# Altium integrated library 兰格封装.IntLib: 1176 symbols (part 1 of 6) (continued)
## SGM6132 (continued)
SOIC 8; 仓库名称: 元件仓; 单位: ֻ; 加工方式: 贴片; 物料代码: *; 物料名称: *; 助记码: *; 规格型号: *; 备注: *
footprint SOIC 8
pins: 0 GND, 1 BS, 2 IN, 3 SW, 4 GND, 5 FB, 6 COMP, 7 EN, 8 SS

## SGM8652
designator U?
规格型号: SOP8; 仓库名称: 元件仓; 单位: ֻ; 加工方式: 贴片; 备注: *
footprint SOP 8
part A pins: 1 OUT, 2 -, 3 +
part B pins: 5 +, 6 -, 7 OUT
part C pins: 4 -, 8 +

## SI4800BDY-T1-E3
designator U?
N-Channel Reduced Qg, Fast Switching MOSFET; 仓库名称: 元件仓; 单位: ֻ; 加工方式: 贴片; 物料名称: *; 物料代码: *; 助记码: *; 规格型号: *; 备注: *
footprint SOP 8
pins: 1 S, 2 S, 3 S, 4 G, 5 D, 6 D, 7 D, 8 D

## STM32F030K6T6
designator U?
LQFP32; 仓库名称: 元件仓; 单位: ֻ; 加工方式: 贴片; 物料名称: *; 物料代码: *; 助记码: *; 规格型号: *; 备注: *
footprint LQFP  32 7X7 (32脚，体宽7x7mm，脚距0.8mm)
pins: 1 VDD, 2 PF0-OSC_IN, 3 PF1-OSC_OUT, 4 NRST, 5 VDDA, 6 PA0, 7 PA1, 8 PA2, 9 PA3, 10 PA4, 11 PA5, 12 PA6, 13 PA7, 14 PB0, 15 PB1, 16 VSS, 17 VDD, 18 PA8, 19 PA9, 20 PA10, 21 PA11, 22 PA12, 23 PA13, 24 PA14, 25 PA15, 26 PB3, 27 PB4, 28 PB5, 29 PB6, 30 PB7, 31 BOOT0, 32 VSS

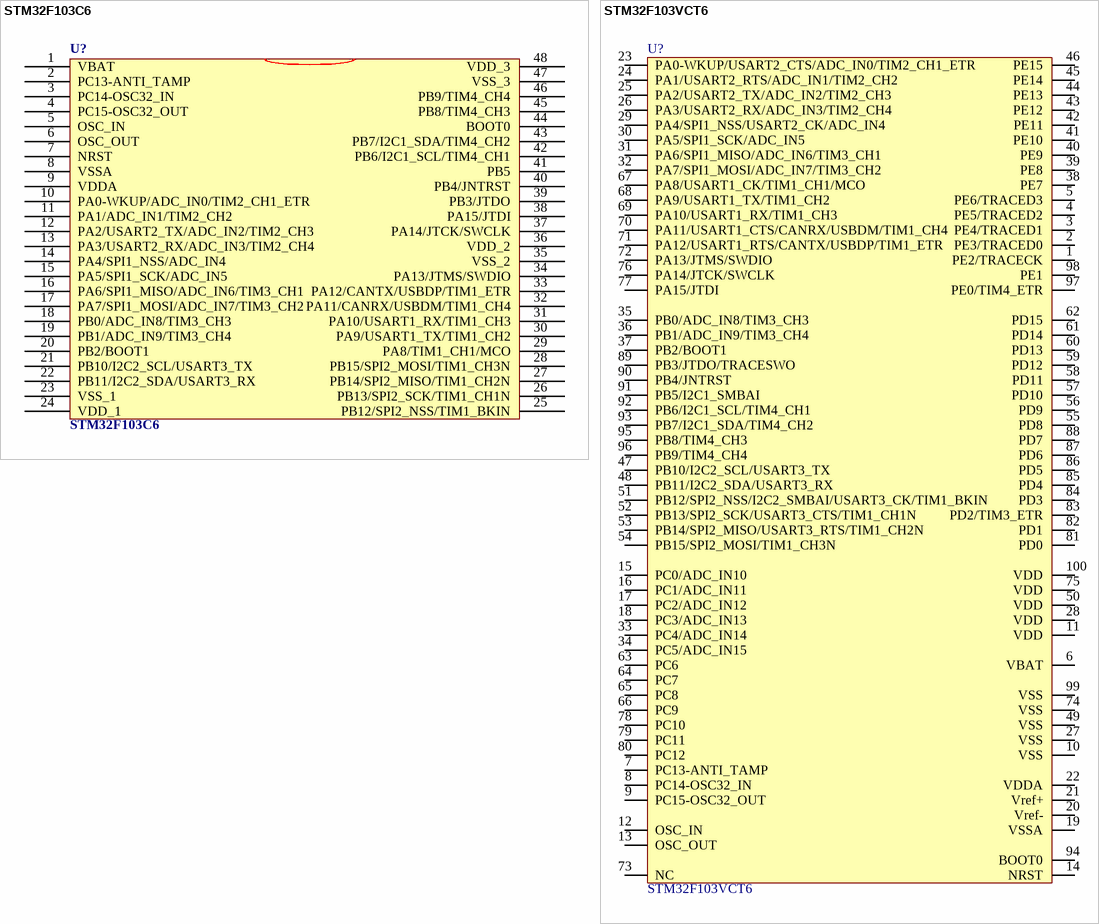
[diagram p7: symbols STM32F103C6 to STM32F103VCT6]

## STM32F103C6
designator U?
LQFP48S; 单位: ֻ; 仓库名称: 元件仓; 加工方式: 贴片; 物料名称: *; 物料代码: *; 助记码: *; 规格型号: *; 备注: *
footprint LQFP  48
pins: 1 VBAT, 2 PC13-ANTI_TAMP, 3 PC14-OSC32_IN, 4 PC15-OSC32_OUT, 5 OSC_IN, 6 OSC_OUT, 7 NRST, 8 VSSA, 9 VDDA, 10 PA0-WKUP/ADC_IN0/TIM2_CH1_ETR, 11 PA1/ADC_IN1/TIM2_CH2, 12 PA2/USART2_TX/ADC_IN2/TIM2_CH3, 13 PA3/USART2_RX/ADC_IN3/TIM2_CH4, 14 PA4/SPI1_NSS/ADC_IN4, 15 PA5/SPI1_SCK/ADC_IN5, 16 PA6/SPI1_MISO/ADC_IN6/TIM3_CH1, 17 PA7/SPI1_MOSI/ADC_IN7/TIM3_CH2, 18 PB0/ADC_IN8/TIM3_CH3, 19 PB1/ADC_IN9/TIM3_CH4, 20 PB2/BOOT1, 21 PB10/I2C2_SCL/USART3_TX, 22 PB11/I2C2_SDA/USART3_RX, 23 VSS_1, 24 VDD_1, 25 PB12/SPI2_NSS/TIM1_BKIN, 26 PB13/SPI2_SCK/TIM1_CH1N, 27 PB14/SPI2_MISO/TIM1_CH2N, 28 PB15/SPI2_MOSI/TIM1_CH3N, 29 PA8/TIM1_CH1/MCO, 30 PA9/USART1_TX/TIM1_CH2, 31 PA10/USART1_RX/TIM1_CH3, 32 PA11/CANRX/USBDM/TIM1_CH4, 33 PA12/CANTX/USBDP/TIM1_ETR, 34 PA13/JTMS/SWDIO, 35 VSS_2, 36 VDD_2, 37 PA14/JTCK/SWCLK, 38 PA15/JTDI, 39 PB3/JTDO, 40 PB4/JNTRST, 41 PB5, 42 PB6/I2C1_SCL/TIM4_CH1, 43 PB7/I2C1_SDA/TIM4_CH2, 44 BOOT0, 45 PB8/TIM4_CH3, 46 PB9/TIM4_CH4, 47 VSS_3, 48 VDD_3
2 alternate drawings of the same symbol

## STM32F103VCT6
designator U?
LQFP100; 仓库名称: 元件仓; 单位: ֻ; 加工方式: 贴片; 物料代码: *; 物料名称: *; 助记码: *; 规格型号: *; 备注: *
footprint LQFP 100
pins: 1 PE2/TRACECK, 2 PE3/TRACED0, 3 PE4/TRACED1, 4 PE5/TRACED2, 5 PE6/TRACED3, 6 VBAT, 7 PC13-ANTI_TAMP, 8 PC14-OSC32_IN, 9 PC15-OSC32_OUT, 10 VSS, 11 VDD, 12 OSC_IN, 13 OSC_OUT, 14 NRST, 15 PC0/ADC_IN10, 16 PC1/ADC_IN11, 17 PC2/ADC_IN12, 18 PC3/ADC_IN13, 19 VSSA, 20 Vref-, 21 Vref+, 22 VDDA, 23 PA0-WKUP/USART2_CTS/ADC_IN0/TIM2_CH1_ETR, 24 PA1/USART2_RTS/ADC_IN1/TIM2_CH2, 25 PA2/USART2_TX/ADC_IN2/TIM2_CH3, 26 PA3/USART2_RX/ADC_IN3/TIM2_CH4, 27 VSS, 28 VDD, 29 PA4/SPI1_NSS/USART2_CK/ADC_IN4, 30 PA5/SPI1_SCK/ADC_IN5, 31 PA6/SPI1_MISO/ADC_IN6/TIM3_CH1, 32 PA7/SPI1_MOSI/ADC_IN7/TIM3_CH2, 33 PC4/ADC_IN14, 34 PC5/ADC_IN15, 35 PB0/ADC_IN8/TIM3_CH3, 36 PB1/ADC_IN9/TIM3_CH4, 37 PB2/BOOT1, 38 PE7, 39 PE8, 40 PE9, 41 PE10, 42 PE11, 43 PE12, 44 PE13, 45 PE14, 46 PE15, 47 PB10/I2C2_SCL/USART3_TX, 48 PB11/I2C2_SDA/USART3_RX, 49 VSS, 50 VDD, 51 PB12/SPI2_NSS/I2C2_SMBAI/USART3_CK/TIM1_BKIN, 52 PB13/SPI2_SCK/USART3_CTS/TIM1_CH1N, 53 PB14/SPI2_MISO/USART3_RTS/TIM1_CH2N, 54 PB15/SPI2_MOSI/TIM1_CH3N, 55 PD8, 56 PD9, 57 PD10, 58 PD11, 59 PD12, 60 PD13, 61 PD14, 62 PD15, 63 PC6, 64 PC7, 65 PC8, 66 PC9, 67 PA8/USART1_CK/TIM1_CH1/MCO, 68 PA9/USART1_TX/TIM1_CH2, 69 PA10/USART1_RX/TIM1_CH3, 70 PA11/USART1_CTS/CANRX/USBDM/TIM1_CH4, 71 PA12/USART1_RTS/CANTX/USBDP/TIM1_ETR, 72 PA13/JTMS/SWDIO, 73 NC, 74 VSS, 75 VDD, 76 PA14/JTCK/SWCLK, 77 PA15/JTDI, 78 PC10, 79 PC11, 80 PC12, 81 PD0, 82 PD1, 83 PD2/TIM3_ETR, 84 PD3, 85 PD4, 86 PD5, 87 PD6, 88 PD7, 89 PB3/JTDO/TRACESWO, 90 PB4/JNTRST, 91 PB5/I2C1_SMBAI, 92 PB6/I2C1_SCL/TIM4_CH1, 93 PB7/I2C1_SDA/TIM4_CH2, 94 BOOT0, 95 PB8/TIM4_CH3, 96 PB9/TIM4_CH4, 97 PE0/TIM4_ETR, 98 PE1, 99 VSS, 100 VDD

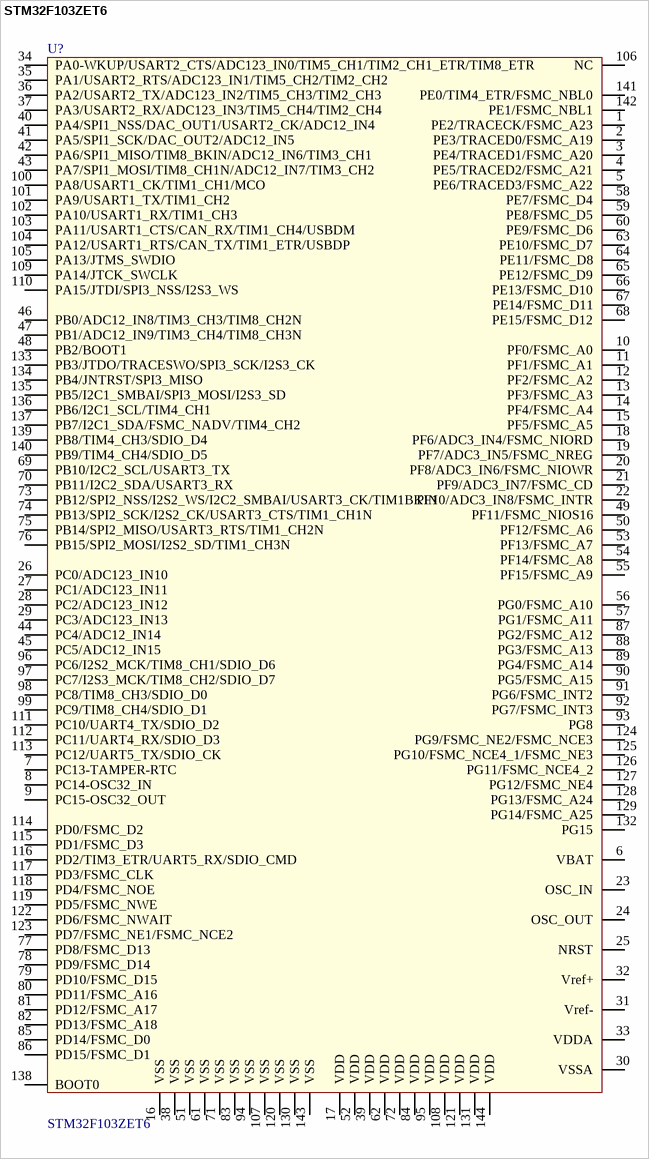
[diagram p8: symbol STM32F103ZET6]

## STM32F103ZET6
designator U?
LQFP144; 仓库名称: 元件仓; 单位: ֻ; 加工方式: 贴片; 物料代码: *; 物料名称: *; 助记码: *; 规格型号: *; 备注: *
footprint LQFP 144
pins: 1 PE2/TRACECK/FSMC_A23, 2 PE3/TRACED0/FSMC_A19, 3 PE4/TRACED1/FSMC_A20, 4 PE5/TRACED2/FSMC_A21, 5 PE6/TRACED3/FSMC_A22, 6 VBAT, 7 PC13-TAMPER-RTC, 8 PC14-OSC32_IN, 9 PC15-OSC32_OUT, 10 PF0/FSMC_A0, 11 PF1/FSMC_A1, 12 PF2/FSMC_A2, 13 PF3/FSMC_A3, 14 PF4/FSMC_A4, 15 PF5/FSMC_A5, 16 VSS, 17 VDD, 18 PF6/ADC3_IN4/FSMC_NIORD, 19 PF7/ADC3_IN5/FSMC_NREG, 20 PF8/ADC3_IN6/FSMC_NIOWR, 21 PF9/ADC3_IN7/FSMC_CD, 22 PF10/ADC3_IN8/FSMC_INTR, 23 OSC_IN, 24 OSC_OUT, 25 NRST, 26 PC0/ADC123_IN10, 27 PC1/ADC123_IN11, 28 PC2/ADC123_IN12, 29 PC3/ADC123_IN13, 30 VSSA, 31 Vref-, 32 Vref+, 33 VDDA, 34 PA0-WKUP/USART2_CTS/ADC123_IN0/TIM5_CH1/TIM2_CH1_ETR/TIM8_ETR, 35 PA1/USART2_RTS/ADC123_IN1/TIM5_CH2/TIM2_CH2, 36 PA2/USART2_TX/ADC123_IN2/TIM5_CH3/TIM2_CH3, 37 PA3/USART2_RX/ADC123_IN3/TIM5_CH4/TIM2_CH4, 38 VSS, 39 VDD, 40 PA4/SPI1_NSS/DAC_OUT1/USART2_CK/ADC12_IN4, 41 PA5/SPI1_SCK/DAC_OUT2/ADC12_IN5, 42 PA6/SPI1_MISO/TIM8_BKIN/ADC12_IN6/TIM3_CH1, 43 PA7/SPI1_MOSI/TIM8_CH1N/ADC12_IN7/TIM3_CH2, 44 PC4/ADC12_IN14, 45 PC5/ADC12_IN15, 46 PB0/ADC12_IN8/TIM3_CH3/TIM8_CH2N, 47 PB1/ADC12_IN9/TIM3_CH4/TIM8_CH3N, 48 PB2/BOOT1, 49 PF11/FSMC_NIOS16, 50 PF12/FSMC_A6, 51 VSS, 52 VDD, 53 PF13/FSMC_A7, 54 PF14/FSMC_A8, 55 PF15/FSMC_A9, 56 PG0/FSMC_A10, 57 PG1/FSMC_A11, 58 PE7/FSMC_D4, 59 PE8/FSMC_D5, 60 PE9/FSMC_D6, 61 VSS, 62 VDD, 63 PE10/FSMC_D7, 64 PE11/FSMC_D8, 65 PE12/FSMC_D9, 66 PE13/FSMC_D10, 67 PE14/FSMC_D11, 68 PE15/FSMC_D12, 69 PB10/I2C2_SCL/USART3_TX, 70 PB11/I2C2_SDA/USART3_RX, 71 VSS, 72 VDD, 73 PB12/SPI2_NSS/I2S2_WS/I2C2_SMBAI/USART3_CK/TIM1BKIN, 74 PB13/SPI2_SCK/I2S2_CK/USART3_CTS/TIM1_CH1N, 75 PB14/SPI2_MISO/USART3_RTS/TIM1_CH2N, 76 PB15/SPI2_MOSI/I2S2_SD/TIM1_CH3N, 77 PD8/FSMC_D13, 78 PD9/FSMC_D14, 79 PD10/FSMC_D15, 80 PD11/FSMC_A16, 81 PD12/FSMC_A17, 82 PD13/FSMC_A18, 83 VSS, 84 VDD, 85 PD14/FSMC_D0, 86 PD15/FSMC_D1, 87 PG2/FSMC_A12, 88 PG3/FSMC_A13, 89 PG4/FSMC_A14, 90 PG5/FSMC_A15, 91 PG6/FSMC_INT2, 92 PG7/FSMC_INT3, 93 PG8, 94 VSS, 95 VDD, 96 PC6/I2S2_MCK/TIM8_CH1/SDIO_D6, 97 PC7/I2S3_MCK/TIM8_CH2/SDIO_D7, 98 PC8/TIM8_CH3/SDIO_D0, 99 PC9/TIM8_CH4/SDIO_D1, 100 PA8/USART1_CK/TIM1_CH1/MCO, 101 PA9/USART1_TX/TIM1_CH2, 102 PA10/USART1_RX/TIM1_CH3, 103 PA11/USART1_CTS/CAN_RX/TIM1_CH4/USBDM, 104 PA12/USART1_RTS/CAN_TX/TIM1_ETR/USBDP, 105 PA13/JTMS_SWDIO, 106 NC, 107 VSS, 108 VDD, 109 PA14/JTCK_SWCLK, 110 PA15/JTDI/SPI3_NSS/I2S3_WS, 111 PC10/UART4_TX/SDIO_D2, 112 PC11/UART4_RX/SDIO_D3, 113 PC12/UART5_TX/SDIO_CK, 114 PD0/FSMC_D2, 115 PD1/FSMC_D3, 116 PD2/TIM3_ETR/UART5_RX/SDIO_CMD, 117 PD3/FSMC_CLK, 118 PD4/FSMC_NOE, 119 PD5/FSMC_NWE, 120 VSS, 121 VDD, 122 PD6/FSMC_NWAIT, 123 PD7/FSMC_NE1/FSMC_NCE2, 124 PG9/FSMC_NE2/FSMC_NCE3, 125 PG10/FSMC_NCE4_1/FSMC_NE3, 126 PG11/FSMC_NCE4_2, 127 PG12/FSMC_NE4, 128 PG13/FSMC_A24, 129 PG14/FSMC_A25, 130 VSS, 131 VDD, 132 PG15, 133 PB3/JTDO/TRACESWO/SPI3_SCK/I2S3_CK, 134 PB4/JNTRST/SPI3_MISO, 135 PB5/I2C1_SMBAI/SPI3_MOSI/I2S3_SD, 136 PB6/I2C1_SCL/TIM4_CH1, 137 PB7/I2C1_SDA/FSMC_NADV/TIM4_CH2, 138 BOOT0, 139 PB8/TIM4_CH3/SDIO_D4, 140 PB9/TIM4_CH4/SDIO_D5, 141 PE0/TIM4_ETR/FSMC_NBL0, 142 PE1/FSMC_NBL1, 143 VSS, 144 VDD

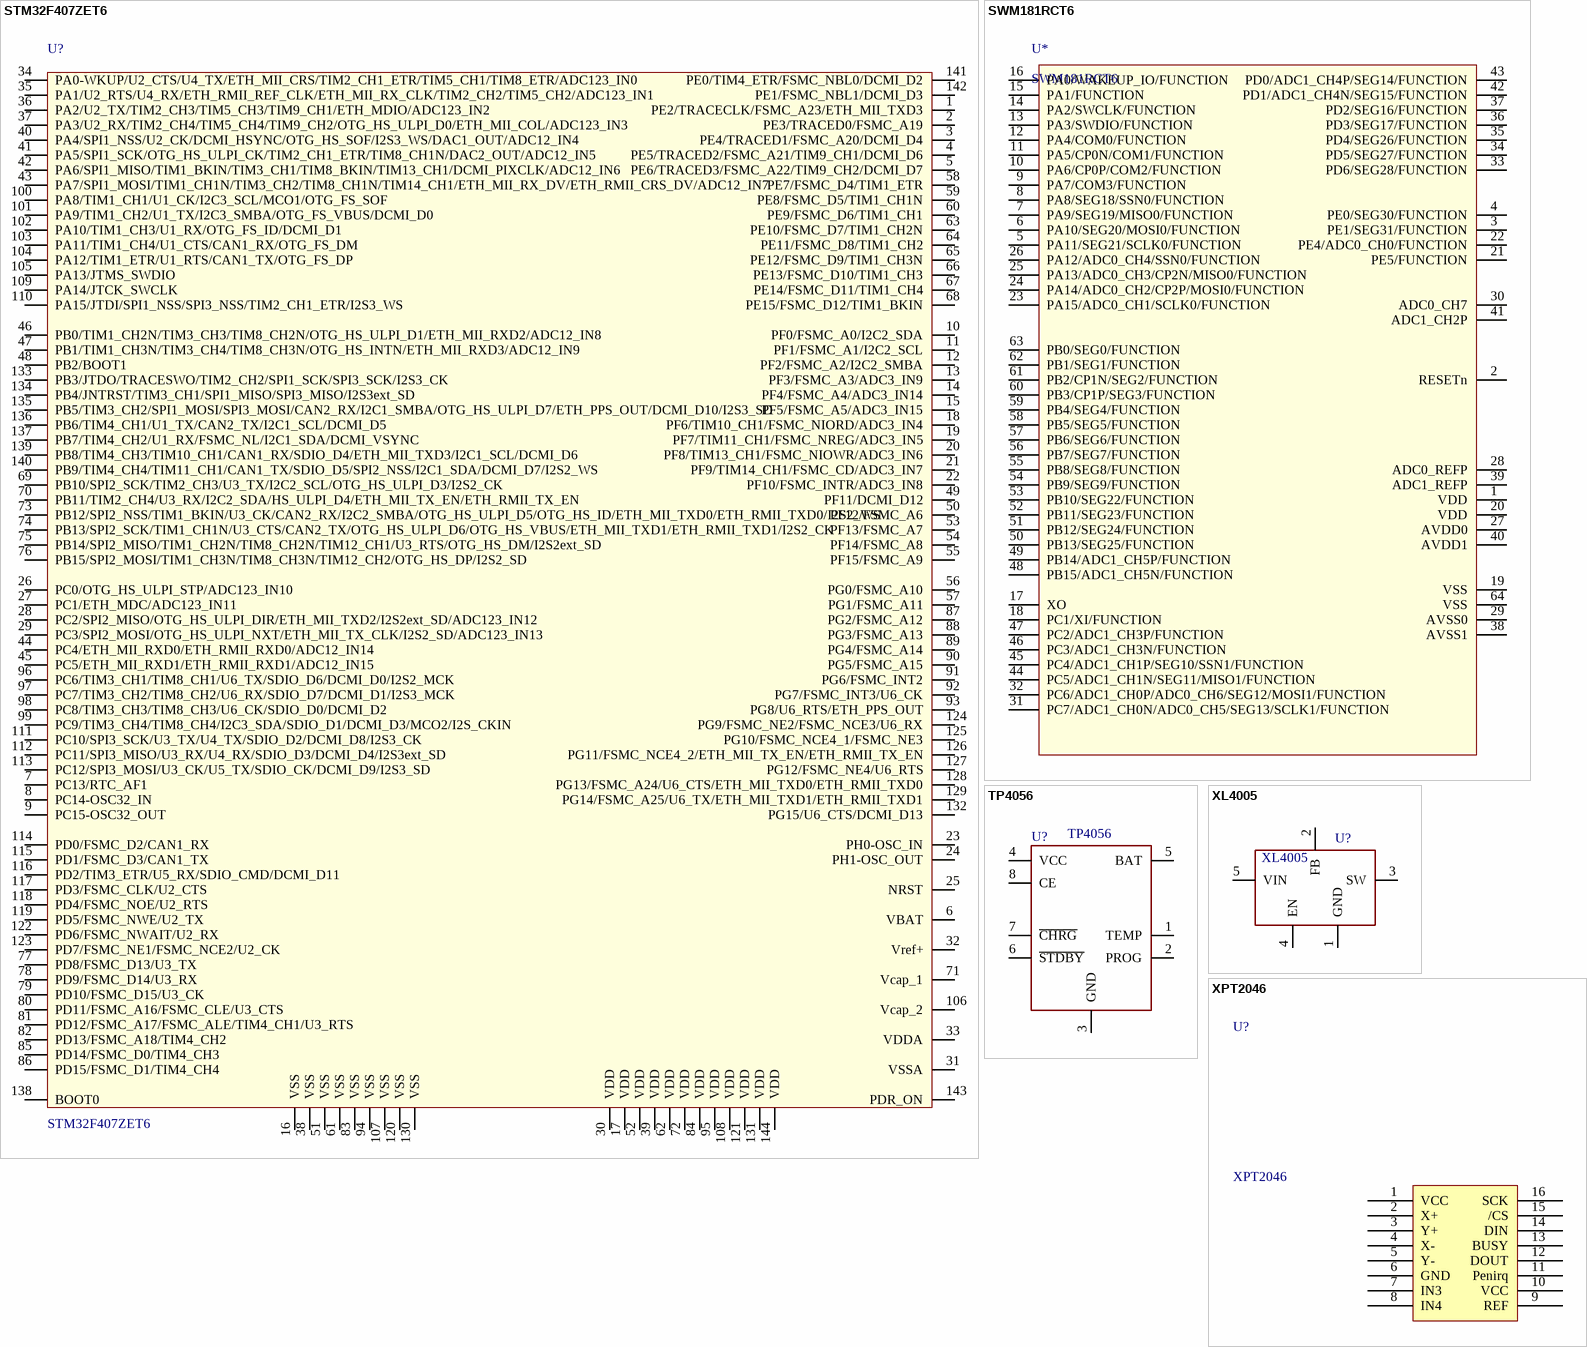
[diagram p9: symbols STM32F407ZET6 to XPT2046]

## STM32F407ZET6
designator U?
LQFP144; 仓库名称: 元件仓; 单位: ֻ; 加工方式: 贴片; 物料名称: *; 物料代码: *; 助记码: *; 规格型号: *; 备注: *
footprint LQFP 144
pins: 1 PE2/TRACECLK/FSMC_A23/ETH_MII_TXD3, 2 PE3/TRACED0/FSMC_A19, 3 PE4/TRACED1/FSMC_A20/DCMI_D4, 4 PE5/TRACED2/FSMC_A21/TIM9_CH1/DCMI_D6, 5 PE6/TRACED3/FSMC_A22/TIM9_CH2/DCMI_D7, 6 VBAT, 7 PC13/RTC_AF1, 8 PC14-OSC32_IN, 9 PC15-OSC32_OUT, 10 PF0/FSMC_A0/I2C2_SDA, 11 PF1/FSMC_A1/I2C2_SCL, 12 PF2/FSMC_A2/I2C2_SMBA, 13 PF3/FSMC_A3/ADC3_IN9, 14 PF4/FSMC_A4/ADC3_IN14, 15 PF5/FSMC_A5/ADC3_IN15, 16 VSS, 17 VDD, 18 PF6/TIM10_CH1/FSMC_NIORD/ADC3_IN4, 19 PF7/TIM11_CH1/FSMC_NREG/ADC3_IN5, 20 PF8/TIM13_CH1/FSMC_NIOWR/ADC3_IN6, 21 PF9/TIM14_CH1/FSMC_CD/ADC3_IN7, 22 PF10/FSMC_INTR/ADC3_IN8, 23 PH0-OSC_IN, 24 PH1-OSC_OUT, 25 NRST, 26 PC0/OTG_HS_ULPI_STP/ADC123_IN10, 27 PC1/ETH_MDC/ADC123_IN11, 28 PC2/SPI2_MISO/OTG_HS_ULPI_DIR/ETH_MII_TXD2/I2S2ext_SD/ADC123_IN12, 29 PC3/SPI2_MOSI/OTG_HS_ULPI_NXT/ETH_MII_TX_CLK/I2S2_SD/ADC123_IN13, 30 VDD, 31 VSSA, 32 Vref+, 33 VDDA, 34 PA0-WKUP/U2_CTS/U4_TX/ETH_MII_CRS/TIM2_CH1_ETR/TIM5_CH1/TIM8_ETR/ADC123_IN0, 35 PA1/U2_RTS/U4_RX/ETH_RMII_REF_CLK/ETH_MII_RX_CLK/TIM2_CH2/TIM5_CH2/ADC123_IN1, 36 PA2/U2_TX/TIM2_CH3/TIM5_CH3/TIM9_CH1/ETH_MDIO/ADC123_IN2, 37 PA3/U2_RX/TIM2_CH4/TIM5_CH4/TIM9_CH2/OTG_HS_ULPI_D0/ETH_MII_COL/ADC123_IN3, 38 VSS, 39 VDD, 40 PA4/SPI1_NSS/U2_CK/DCMI_HSYNC/OTG_HS_SOF/I2S3_WS/DAC1_OUT/ADC12_IN4, 41 PA5/SPI1_SCK/OTG_HS_ULPI_CK/TIM2_CH1_ETR/TIM8_CH1N/DAC2_OUT/ADC12_IN5, 42 PA6/SPI1_MISO/TIM1_BKIN/TIM3_CH1/TIM8_BKIN/TIM13_CH1/DCMI_PIXCLK/ADC12_IN6, 43 PA7/SPI1_MOSI/TIM1_CH1N/TIM3_CH2/TIM8_CH1N/TIM14_CH1/ETH_MII_RX_DV/ETH_RMII_CRS_DV/ADC12_IN7, 44 PC4/ETH_MII_RXD0/ETH_RMII_RXD0/ADC12_IN14, 45 PC5/ETH_MII_RXD1/ETH_RMII_RXD1/ADC12_IN15, 46 PB0/TIM1_CH2N/TIM3_CH3/TIM8_CH2N/OTG_HS_ULPI_D1/ETH_MII_RXD2/ADC12_IN8, 47 PB1/TIM1_CH3N/TIM3_CH4/TIM8_CH3N/OTG_HS_INTN/ETH_MII_RXD3/ADC12_IN9, 48 PB2/BOOT1, 49 PF11/DCMI_D12, 50 PF12/FSMC_A6, 51 VSS, 52 VDD, 53 PF13/FSMC_A7, 54 PF14/FSMC_A8, 55 PF15/FSMC_A9, 56 PG0/FSMC_A10, 57 PG1/FSMC_A11, 58 PE7/FSMC_D4/TIM1_ETR, 59 PE8/FSMC_D5/TIM1_CH1N, 60 PE9/FSMC_D6/TIM1_CH1, 61 VSS, 62 VDD, 63 PE10/FSMC_D7/TIM1_CH2N, 64 PE11/FSMC_D8/TIM1_CH2, 65 PE12/FSMC_D9/TIM1_CH3N, 66 PE13/FSMC_D10/TIM1_CH3, 67 PE14/FSMC_D11/TIM1_CH4, 68 PE15/FSMC_D12/TIM1_BKIN, 69 PB10/SPI2_SCK/TIM2_CH3/U3_TX/I2C2_SCL/OTG_HS_ULPI_D3/I2S2_CK, 70 PB11/TIM2_CH4/U3_RX/I2C2_SDA/HS_ULPI_D4/ETH_MII_TX_EN/ETH_RMII_TX_EN, 71 Vcap_1, 72 VDD, 73 PB12/SPI2_NSS/TIM1_BKIN/U3_CK/CAN2_RX/I2C2_SMBA/OTG_HS_ULPI_D5/OTG_HS_ID/ETH_MII_TXD0/ETH_RMII_TXD0/I2S2_WS, 74 PB13/SPI2_SCK/TIM1_CH1N/U3_CTS/CAN2_TX/OTG_HS_ULPI_D6/OTG_HS_VBUS/ETH_MII_TXD1/ETH_RMII_TXD1/I2S2_CK, 75 PB14/SPI2_MISO/TIM1_CH2N/TIM8_CH2N/TIM12_CH1/U3_RTS/OTG_HS_DM/I2S2ext_SD, 76 PB15/SPI2_MOSI/TIM1_CH3N/TIM8_CH3N/TIM12_CH2/OTG_HS_DP/I2S2_SD, 77 PD8/FSMC_D13/U3_TX, 78 PD9/FSMC_D14/U3_RX, 79 PD10/FSMC_D15/U3_CK, 80 PD11/FSMC_A16/FSMC_CLE/U3_CTS, 81 PD12/FSMC_A17/FSMC_ALE/TIM4_CH1/U3_RTS, 82 PD13/FSMC_A18/TIM4_CH2, 83 VSS, 84 VDD, 85 PD14/FSMC_D0/TIM4_CH3, 86 PD15/FSMC_D1/TIM4_CH4, 87 PG2/FSMC_A12, 88 PG3/FSMC_A13, 89 PG4/FSMC_A14, 90 PG5/FSMC_A15, 91 PG6/FSMC_INT2, 92 PG7/FSMC_INT3/U6_CK, 93 PG8/U6_RTS/ETH_PPS_OUT, 94 VSS, 95 VDD, 96 PC6/TIM3_CH1/TIM8_CH1/U6_TX/SDIO_D6/DCMI_D0/I2S2_MCK, 97 PC7/TIM3_CH2/TIM8_CH2/U6_RX/SDIO_D7/DCMI_D1/I2S3_MCK, 98 PC8/TIM3_CH3/TIM8_CH3/U6_CK/SDIO_D0/DCMI_D2, 99 PC9/TIM3_CH4/TIM8_CH4/I2C3_SDA/SDIO_D1/DCMI_D3/MCO2/I2S_CKIN, 100 PA8/TIM1_CH1/U1_CK/I2C3_SCL/MCO1/OTG_FS_SOF, 101 PA9/TIM1_CH2/U1_TX/I2C3_SMBA/OTG_FS_VBUS/DCMI_D0, 102 PA10/TIM1_CH3/U1_RX/OTG_FS_ID/DCMI_D1, 103 PA11/TIM1_CH4/U1_CTS/CAN1_RX/OTG_FS_DM, 104 PA12/TIM1_ETR/U1_RTS/CAN1_TX/OTG_FS_DP, 105 PA13/JTMS_SWDIO, 106 Vcap_2, 107 VSS, 108 VDD, 109 PA14/JTCK_SWCLK, 110 PA15/JTDI/SPI1_NSS/SPI3_NSS/TIM2_CH1_ETR/I2S3_WS, 111 PC10/SPI3_SCK/U3_TX/U4_TX/SDIO_D2/DCMI_D8/I2S3_CK, 112 PC11/SPI3_MISO/U3_RX/U4_RX/SDIO_D3/DCMI_D4/I2S3ext_SD, 113 PC12/SPI3_MOSI/U3_CK/U5_TX/SDIO_CK/DCMI_D9/I2S3_SD, 114 PD0/FSMC_D2/CAN1_RX, 115 PD1/FSMC_D3/CAN1_TX, 116 PD2/TIM3_ETR/U5_RX/SDIO_CMD/DCMI_D11, 117 PD3/FSMC_CLK/U2_CTS, 118 PD4/FSMC_NOE/U2_RTS, 119 PD5/FSMC_NWE/U2_TX, 120 VSS, 121 VDD, 122 PD6/FSMC_NWAIT/U2_RX, 123 PD7/FSMC_NE1/FSMC_NCE2/U2_CK, 124 PG9/FSMC_NE2/FSMC_NCE3/U6_RX, 125 PG10/FSMC_NCE4_1/FSMC_NE3, 126 PG11/FSMC_NCE4_2/ETH_MII_TX_EN/ETH_RMII_TX_EN, 127 PG12/FSMC_NE4/U6_RTS, 128 PG13/FSMC_A24/U6_CTS/ETH_MII_TXD0/ETH_RMII_TXD0, 129 PG14/FSMC_A25/U6_TX/ETH_MII_TXD1/ETH_RMII_TXD1, 130 VSS, 131 VDD, 132 PG15/U6_CTS/DCMI_D13, 133 PB3/JTDO/TRACESWO/TIM2_CH2/SPI1_SCK/SPI3_SCK/I2S3_CK, 134 PB4/JNTRST/TIM3_CH1/SPI1_MISO/SPI3_MISO/I2S3ext_SD, 135 PB5/TIM3_CH2/SPI1_MOSI/SPI3_MOSI/CAN2_RX/I2C1_SMBA/OTG_HS_ULPI_D7/ETH_PPS_OUT/DCMI_D10/I2S3_SD, 136 PB6/TIM4_CH1/U1_TX/CAN2_TX/I2C1_SCL/DCMI_D5, 137 PB7/TIM4_CH2/U1_RX/FSMC_NL/I2C1_SDA/DCMI_VSYNC, 138 BOOT0, 139 PB8/TIM4_CH3/TIM10_CH1/CAN1_RX/SDIO_D4/ETH_MII_TXD3/I2C1_SCL/DCMI_D6, 140 PB9/TIM4_CH4/TIM11_CH1/CAN1_TX/SDIO_D5/SPI2_NSS/I2C1_SDA/DCMI_D7/I2S2_WS, 141 PE0/TIM4_ETR/FSMC_NBL0/DCMI_D2, 142 PE1/FSMC_NBL1/DCMI_D3, 143 PDR_ON, 144 VDD

## SWM181RCT6
designator U*
LQFP64; 单位: ֻ; 仓库名称: 元件仓; 加工方式: 贴片; 物料名称: SWM181RCT6; 物料代码: *; 规格型号: *; 助记码: *; 备注: *
footprint LQFP  64
pins: 1 VDD, 2 RESETn, 3 PE1/SEG31/FUNCTION, 4 PE0/SEG30/FUNCTION, 5 PA11/SEG21/SCLK0/FUNCTION, 6 PA10/SEG20/MOSI0/FUNCTION, 7 PA9/SEG19/MISO0/FUNCTION, 8 PA8/SEG18/SSN0/FUNCTION, 9 PA7/COM3/FUNCTION, 10 PA6/CP0P/COM2/FUNCTION, 11 PA5/CP0N/COM1/FUNCTION, 12 PA4/COM0/FUNCTION, 13 PA3/SWDIO/FUNCTION, 14 PA2/SWCLK/FUNCTION, 15 PA1/FUNCTION, 16 PA0/WAKEUP_IO/FUNCTION, 17 XO, 18 PC1/XI/FUNCTION, 19 VSS, 20 VDD, 21 PE5/FUNCTION, 22 PE4/ADC0_CH0/FUNCTION, 23 PA15/ADC0_CH1/SCLK0/FUNCTION, 24 PA14/ADC0_CH2/CP2P/MOSI0/FUNCTION, 25 PA13/ADC0_CH3/CP2N/MISO0/FUNCTION, 26 PA12/ADC0_CH4/SSN0/FUNCTION, 27 AVDD0, 28 ADC0_REFP, 29 AVSS0, 30 ADC0_CH7, 31 PC7/ADC1_CH0N/ADC0_CH5/SEG13/SCLK1/FUNCTION, 32 PC6/ADC1_CH0P/ADC0_CH6/SEG12/MOSI1/FUNCTION, 33 PD6/SEG28/FUNCTION, 34 PD5/SEG27/FUNCTION, 35 PD4/SEG26/FUNCTION, 36 PD3/SEG17/FUNCTION, 37 PD2/SEG16/FUNCTION, 38 AVSS1, 39 ADC1_REFP, 40 AVDD1, 41 ADC1_CH2P, 42 PD1/ADC1_CH4N/SEG15/FUNCTION, 43 PD0/ADC1_CH4P/SEG14/FUNCTION, 44 PC5/ADC1_CH1N/SEG11/MISO1/FUNCTION, 45 PC4/ADC1_CH1P/SEG10/SSN1/FUNCTION, 46 PC3/ADC1_CH3N/FUNCTION, 47 PC2/ADC1_CH3P/FUNCTION, 48 PB15/ADC1_CH5N/FUNCTION, 49 PB14/ADC1_CH5P/FUNCTION, 50 PB13/SEG25/FUNCTION, 51 PB12/SEG24/FUNCTION, 52 PB11/SEG23/FUNCTION, 53 PB10/SEG22/FUNCTION, 54 PB9/SEG9/FUNCTION, 55 PB8/SEG8/FUNCTION, 56 PB7/SEG7/FUNCTION, 57 PB6/SEG6/FUNCTION, 58 PB5/SEG5/FUNCTION, 59 PB4/SEG4/FUNCTION, 60 PB3/CP1P/SEG3/FUNCTION, 61 PB2/CP1N/SEG2/FUNCTION, 62 PB1/SEG1/FUNCTION, 63 PB0/SEG0/FUNCTION, 64 VSS

## TP4056
designator U?
SO  8-9; 仓库名称: 元件仓; 单位: ֻ; 加工方式: 贴片; 物料代码: *; 物料名称: *; 助记码: *; 规格型号: *; 备注: *
footprint SO 8-9
pins: 1 TEMP, 2 PROG, 3 GND, 4 VCC, 5 BAT, 6 ~{STDBY}, 7 ~{CHRG}, 8 CE

## XL4005
designator U?
TO 263; 仓库名称: 元件仓; 单位: ֻ; 加工方式: 贴片; 物料名称: *; 物料代码: *; 助记码: *; 规格型号: *; 备注: *
footprint TO 263
pins: 1 GND, 2 FB, 3 SW, 4 EN, 5 VIN

## XPT2046
designator U?
HR2046贴片IC; 物料代码: 3.01.04.02.0081; 助记码: HR2046TPIC; 仓库名称: 元件仓; 规格型号: TSSOP-16; 单位: ֻ; 加工方式: 贴片; 物料名称: HR2046贴片IC
footprint TSSOP 16 (2046)
pins: 1 VCC, 2 X+, 3 Y+, 4 X-, 5 Y-, 6 GND, 7 IN3, 8 IN4, 9 REF, 10 VCC, 11 Penirq, 12 DOUT, 13 BUSY, 14 DIN, 15 /CS, 16 SCK


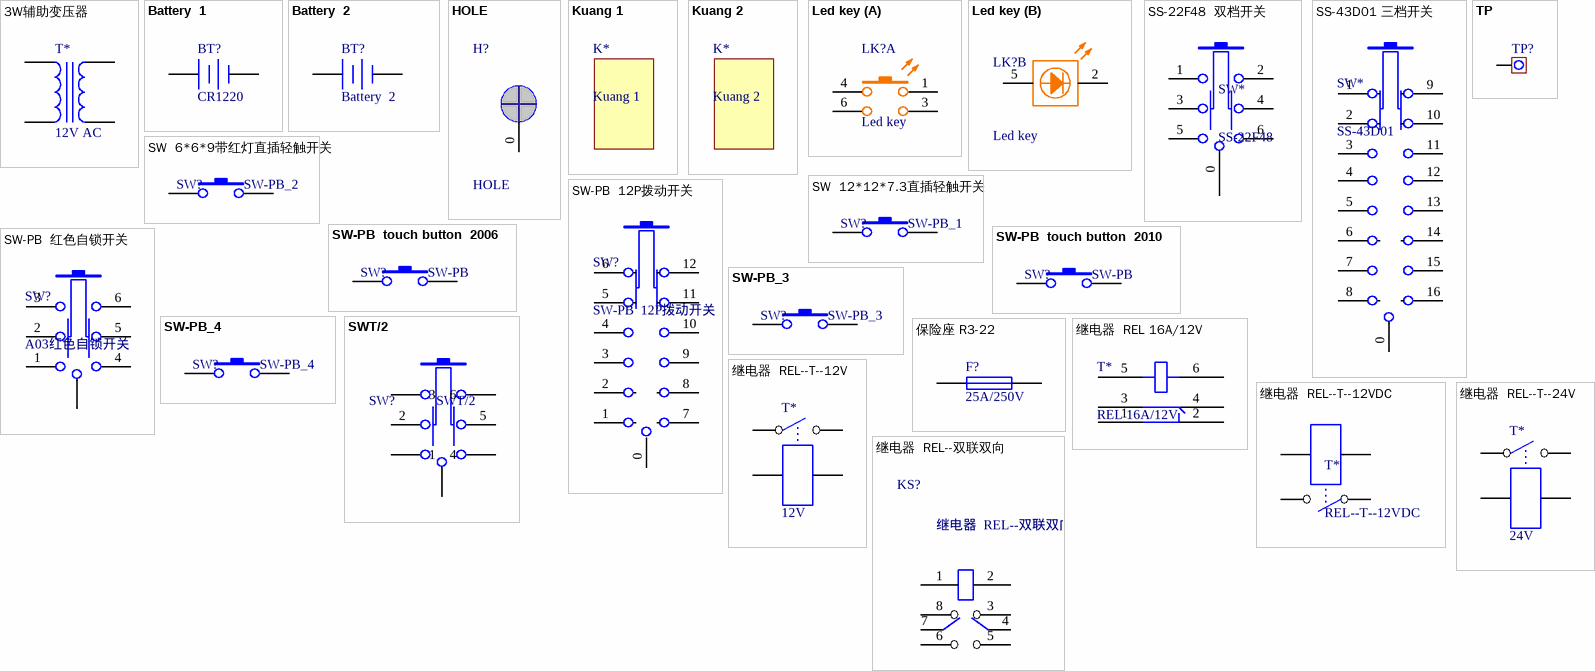
[diagram p10: symbols 3W辅助变压器 to 继电器  REL--双联双向]

## 3W辅助变压器
designator T*, comment 12V AC
3W辅助变压器; 物料代码: 3.02.01.02.0009; 助记码: 3WFZBYQ; 加工方式: 插件; 规格型号: 输入230V/AC 输出12V/AC 3W; 单位: 个; 仓库名称: 五金仓; 物料名称: 3W辅助变压器; 备注: *
footprint 3W辅助变压器　 (输入230V/AC 输出12V/AC 3W)
pins: 1, 2, 3, 4

## Battery  1
designator BT?, comment CR1220
Multicell Battery; 单位: 个; 加工方式: 贴片; 物料代码: *; 物料名称: *; 助记码: *; 规格型号: *; 仓库名称: *; 备注: *
footprint bttery
pins: 1 +, 2 -

## Battery  2
designator BT?
电源孔; 备注: 电源位，焊接电源线; 物料代码: *; 物料名称: *; 助记码: *; 规格型号: *; 单位: *; 仓库名称: *; 加工方式: *
footprint BAT (电源孔)
pins: 1 +, 2 -

## HOLE
designator H?
螺丝孔; 加工方式: 无须加工; 备注: 螺丝孔，无须加工; 物料代码: *; 物料名称: 螺丝孔; 仓库名称: *; 助记码: *; 规格型号: *; 单位: *
footprint HOLE
pins: 0

## Kuang 1
designator K*
按键框   3P   2006用; 备注: 按键框，无须加工; 物料代码: *; 物料名称: 按键框   3P   2006用; 助记码: *; 规格型号: *; 单位: *; 仓库名称: *; 加工方式: *
footprint 框1 (2006用)

## Kuang 2
designator K*
按键框   2P   2010用; 备注: 按键框，无须加工; 物料代码: *; 物料名称: 按键框   2P   2010用; 助记码: *; 规格型号: *; 单位: *; 仓库名称: *; 加工方式: *
footprint 框2 (2010用)

## Led key
designator LK?
物料代码: *; 物料名称: *; 助记码: *; 规格型号: *; 单位: *; 备注: *; 仓库名称: *; 加工方式: *
footprint LK (led key)
part A pins: 1 SW, 3 SW, 4 SW, 6 SW
part B pins: 2, 5

## SS-22F48  双档开关
designator SW*, comment SS-22F48
SS-22F48开关; 单位: ֻ; 物料代码: 3.02.07.01.01.0003; 助记码: SS-22F48KG; 仓库名称: 五金仓; 加工方式: 插件; 物料名称: SS-22F48开关
footprint SS-22F48  双档开关
pins: 0, 1, 2, 3, 4, 5, 6

## SS-43D01 三档开关
designator SW*, comment SS-43D01
SS-43D01开关; 单位: ֻ; 物料代码: 3.02.07.01.01.0002; 仓库名称: 五金仓; 加工方式: 插件; 物料名称: SS-43D01开关
footprint SS-43D01 三档开关
pins: 0, 1, 2, 3, 4, 5, 6, 7, 8, 9, 10, 11, 12, 13, 14, 15, 16

## SW  6*6*9带红灯直插轻触开关
designator SW?, comment SW-PB_2
6*6*9带红灯直插轻触开关; 物料代码: 3.02.07.02.01.0002; 助记码: 6*6*9DHDZCQCKG; 仓库名称: 五金仓; 单位: 个; 加工方式: 插件; 物料名称: 6*6*9带红灯直插轻触开关; 规格型号: *; 备注: *
footprint SW  6*6*9带红灯直插轻触开关
pins: 1, 2

## SW  12*12*7.3直插轻触开关
designator SW?, comment SW-PB_1
12*12*7.3直插轻触开关; 物料代码: 3.02.07.02.01.0001; 助记码: 12*12*7.3ZCQCKG; 规格型号: 方柄; 仓库名称: 五金仓; 单位: 个; 物料名称: 12*12*7.3直插轻触开关; 备注: *; 加工方式: *
footprint 12*12*7.3轻触开关
pins: 1, 2

## SW-PB  12P拨动开关
designator SW?
PS-42F18-4PT2T拨动开关; 单位: ֻ; 物料代码: 3.02.07.01.01.0001; 仓库名称: 五金仓; 加工方式: 插件; 物料名称: PS-42F18-4PT2T拨动开关
footprint SW-PB  12P (PS-42F18-49T2T 拨动开关)
pins: 0 GND, 1, 2, 3, 4, 5, 6, 7, 8, 9, 10, 11, 12

## SW-PB  touch button  2006
designator SW?, comment SW-PB
SW-PB  touch button  2006; 备注: 纯焊盘，无须加工; 加工方式: *; 物料名称: *; 物料代码: *; 仓库代码: *; 单位: *; 规格型号: *; 助记码: *
footprint touch button (2006用)
pins: 1, 2

## SW-PB  touch button  2010
designator SW?, comment SW-PB
SW-PB  touch button  2010; 备注: 纯焊盘，无须加工; 加工方式: *; 物料名称: *; 物料代码: *; 仓库代码: *; 单位: *; 规格型号: *; 助记码: *
footprint touch button（big） (2010用)
pins: 1, 2

## SW-PB  红色自锁开关
designator SW?, comment A03红色自锁开关
A03 红色自锁开关; 单位: ֻ; 物料代码: 3.02.07.08.0001; 助记码: A03HSZSKG; 仓库名称: 五金仓; 加工方式: 插件; 物料名称: A03 红色自锁开关
footprint A03 红色自锁开关
pins: 0 GND, 1, 2, 3, 4, 5, 6

## SW-PB_3
designator SW?
手机唛用; 仓库名称: 五金仓; 单位: ֻ; 加工方式: 插件; 物料代码: *; 物料名称: *; 助记码: *; 规格型号: *; 备注: *
footprint SW  6*3.5*5
pins: 1, 2

## SW-PB_4
designator SW?
手机唛用（无）; 仓库名称: 五金仓; 加工方式: 贴片; 物料代码: *; 物料名称: *; 助记码: *; 规格型号: *; 单位: *; 备注: *
footprint SW  0.6*0.6
pins: 1, 2

## SWT/2
designator SW?
（123）和（456）独立；按下，（21）（52）连接；未按，（23）（56）连接; 仓库名称: 五金仓; 加工方式: 插件; 物料代码: *; 物料名称: *; 助记码: *; 规格型号: *; 单位: *; 备注: *
footprint SWT/2 (2010用。（123）和（456）独立；按下，（21）（52）连接；未按，（23）（56）)
pins: 0 GND, 1, 2, 3, 4, 5, 6

## TP
designator TP?
测试点; 备注: 测试点，无须加工; 物料名称: *; 物料代码: *; 助记码: *; 仓库名称: *; 单位: *; 规格型号: *; 加工方式: *
footprint 测试点
pins: 1